# Altium footprint library Micro Switch.PcbLib: 75 footprints (part 2 of 5)
Each footprint in its own frame and in the unit in brackets; x right, y up, seen from the top. Pads: shape width x height; smd on the part's side, far side on the other; paste and mask are expansions set on the pad; w line width, h text height; cw(c..) or ccw(c..) is an arc to the next point about the centre after c.
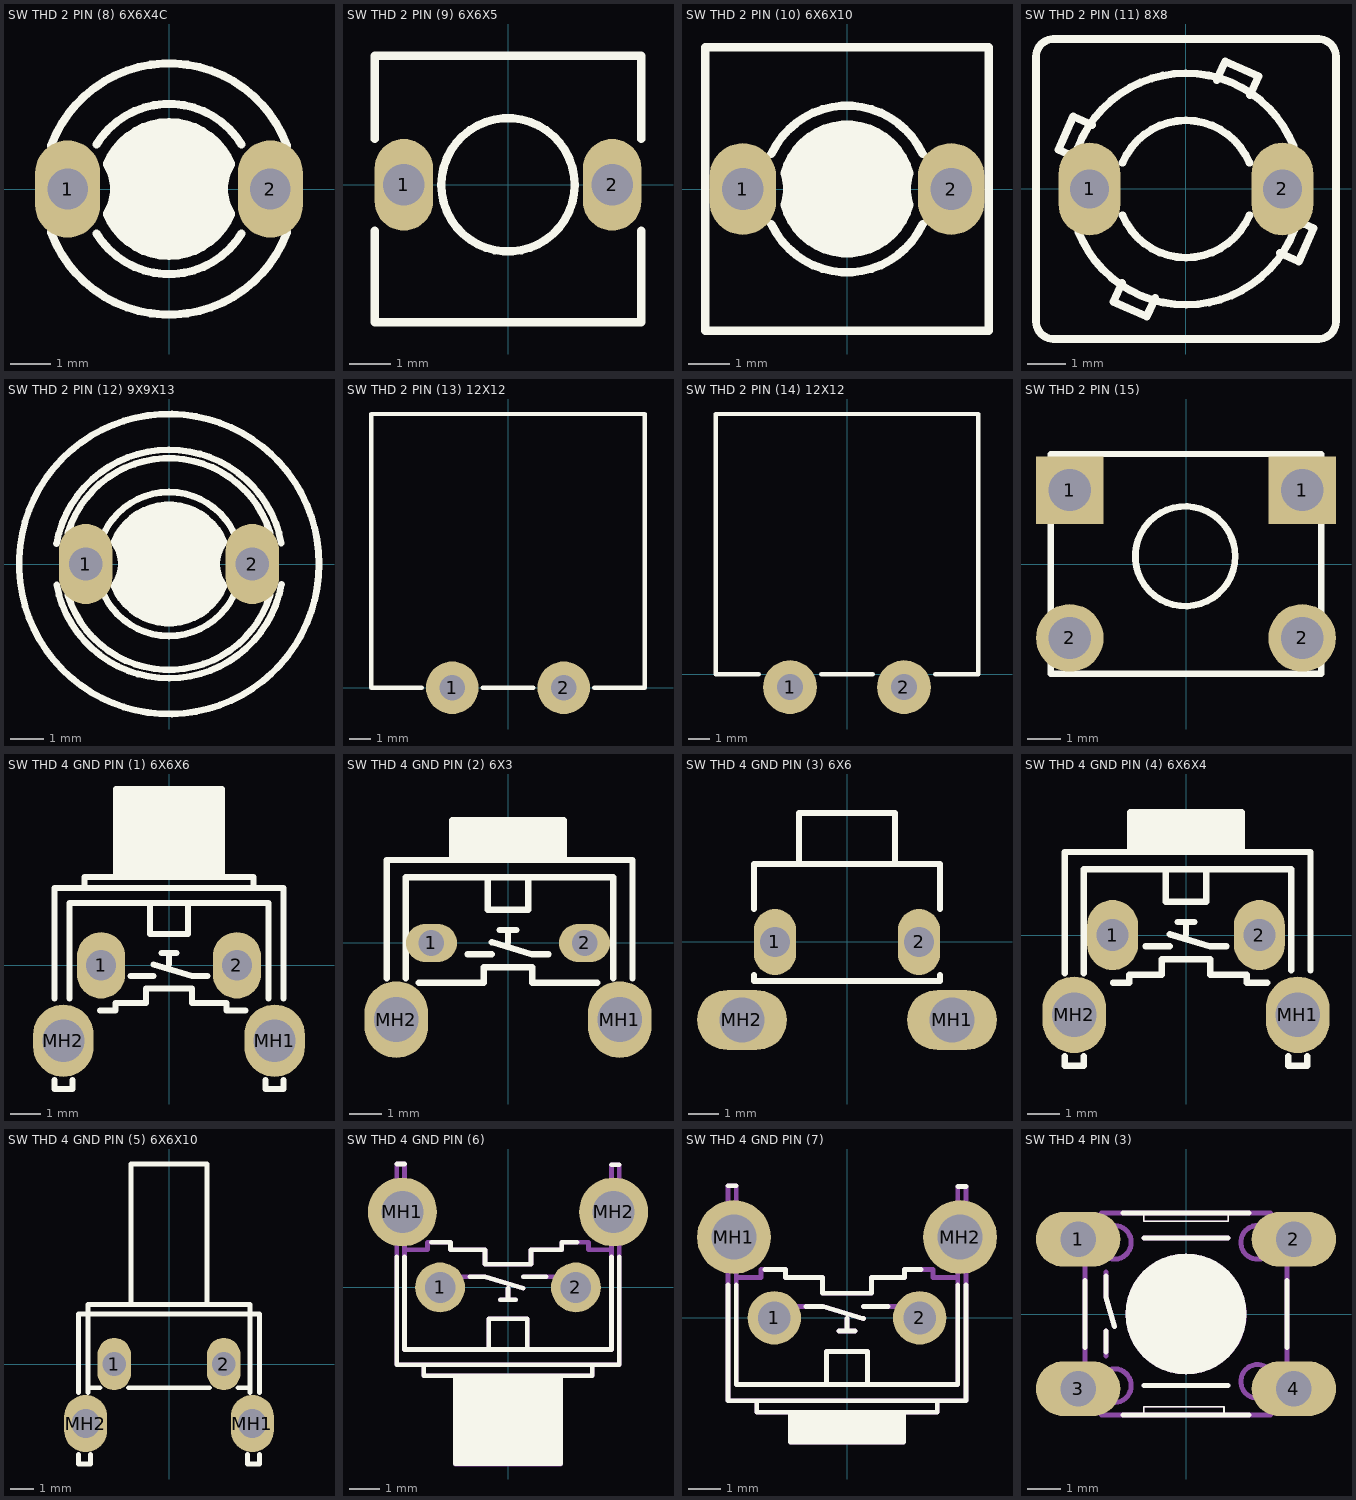
[diagram p1: the footprints below, top view; thin cyan lines are the x and y axes]

## SW THD 2 PIN (8) 6X6X4C [mm]
height 4.3
pads (2):
  oval 1.6x2.4 hole 1 mask+0.1: 1(-2.5,0) 2(2.5,0)
Top Overlay:
  region: -1.533,-0.613 -1.456,-0.471 -1.366,-0.161 -1.366,0.161 -1.456,0.471 -1.533,0.613 -1.472,0.766 -1.292,1.041 -1.062,1.275 -0.79,1.459 -0.486,1.586 -0.164,1.651 0.164,1.651 0.486,1.586 0.79,1.459 1.062,1.275 1.292,1.041 1.472,0.766 1.533,0.613 1.456,0.471 1.366,0.161 1.366,-0.161 1.456,-0.471 1.533,-0.613 1.472,-0.766 1.292,-1.041 1.062,-1.275 0.79,-1.459 0.486,-1.586 0.164,-1.651 -0.164,-1.651 -0.486,-1.586 -0.79,-1.459 -1.062,-1.275 -1.292,-1.041 -1.472,-0.766
  lines w0.2: -2.912,-1.059 ccw(c0,0) 2.912,-1.059 ; -2.912,1.059 cw(c0,0) 2.912,1.059 ; -1.789,-1.1 ccw(c0,0) 1.789,-1.1 ; -1.789,1.1 cw(c0,0) 1.789,1.1 ; -1.533,-0.613 ccw(c0,0) 1.533,-0.613 cw(c2.5,0) 1.533,0.613 ccw(c0,0) -1.533,0.613 cw(c-2.5,0) -1.533,-0.613
3D body "SKRGAA.STEP": height 4.33, standoff -3.47, extent -3.159,-3.1 3.16,3.1

## SW THD 2 PIN (9) 6X6X5 [mm]
pads (2):
  oval 1.4x2.2 hole 1 mask+0.1: 1(-2.5,0) 2(2.5,0)
Top Overlay:
  circle w0.2: c0,0 r1.6
  lines w0.2: -3.2,-1.1 -3.2,-3.3 3.2,-3.3 3.2,-1.1 ; -3.2,1.1 -3.2,3.1 3.2,3.1 3.2,1.1
3D body "82574 tact switch.stp": height 5, standoff -5.08, extent -3.117,-3.2 3.117,3.029

## SW THD 2 PIN (10) 6X6X10 [mm]
height 9.5
pads (2):
  oval 1.6x2.2 hole 1 mask+0.1: 1(-2.5,0) 2(2.5,0)
Top Overlay:
  region: -1.499,-0.375 -1.469,-0.284 -1.435,-0.096 -1.435,0.096 -1.469,0.284 -1.499,0.375 -1.457,0.541 -1.303,0.847 -1.086,1.112 -0.816,1.323 -0.506,1.47 -0.171,1.545 0.171,1.545 0.506,1.47 0.816,1.323 1.086,1.112 1.303,0.847 1.457,0.541 1.499,0.375 1.469,0.284 1.435,0.096 1.435,-0.096 1.469,-0.284 1.499,-0.375 1.457,-0.541 1.303,-0.847 1.086,-1.112 0.816,-1.323 0.506,-1.47 0.171,-1.545 -0.171,-1.545 -0.506,-1.47 -0.816,-1.323 -1.086,-1.112 -1.303,-0.847 -1.457,-0.541
  lines w0.2: -1.816,-0.838 ccw(c0,0) 1.816,-0.838 ; -1.816,0.838 cw(c0,0) 1.816,0.838 ; -3.4,-3.4 3.4,-3.4 3.4,3.4 -3.4,3.4 -3.4,-3.4 ; -1.499,-0.375 ccw(c-2.5,0) -1.499,0.375 cw(c0,0) 1.499,0.375 ccw(c2.5,0) 1.499,-0.375 cw(c0,0) -1.499,-0.375
3D body "SKQKAJ.STEP": height 9.53, standoff -3.47, extent -3.3,-3.3 3.3,3.3

## SW THD 2 PIN (11) 8X8 [mm]
height 5.5
pads (2):
  oval 1.6x2.4 hole 1 mask+0.1: 1(-2.5,0) 2(2.5,0)
Top Overlay:
  lines w0.2: -3.886,-3.429 ccw(c-3.429,-3.429) -3.429,-3.886 ; -3.886,3.429 cw(c-3.429,3.429) -3.429,3.886 ; -3.059,0.906 -3.302,1.016 -2.921,1.88 -2.435,1.659 ; -2.801,1.075 cw(c0,0) 2.795,1.091 ; -2.795,-1.091 ccw(c0,0) 2.801,-1.075 ; -1.659,-2.435 -1.88,-2.921 -1.016,-3.302 -0.795,-2.816 ; -1.643,-0.68 ccw(c0,0) 1.643,-0.68 ; -1.643,0.68 cw(c0,0) 1.643,0.68 ; 0.795,2.816 1.016,3.302 1.88,2.921 1.659,2.435 ; 2.435,-1.659 2.921,-1.88 3.302,-1.016 3.059,-0.906 ; 3.429,-3.886 ccw(c3.429,-3.429) 3.886,-3.429 ; 3.886,3.428 cw(c3.886,3.428) 3.886,3.429 ccw(c3.429,3.429) 3.429,3.886 ; 3.429,3.886 ccw(c3.429,3.886) 3.429,3.886
  lines w0.203: -3.886,-3.429 -3.886,3.429 ; -3.429,-3.886 3.429,-3.886 ; -3.429,3.886 3.429,3.886 ; 3.886,-3.429 3.886,3.428
3D body "SKPDAC.STEP": height 5.53, standoff -3.47, extent -3.9,-4.1 3.9,3.9

## SW THD 2 PIN (12) 9X9X13 [mm]
height 13
pads (2):
  oval 1.6x2.4 hole 1 mask+0.1: 1(-2.5,0) 2(2.5,0)
Top Overlay:
  circle w0.2: c0,0 r4.5
  region: -1.656,-0.653 -1.605,-0.581 -1.522,-0.427 -1.466,-0.261 -1.437,-0.088 -1.437,0.087 -1.465,0.26 -1.522,0.426 -1.605,0.58 -1.655,0.652 -1.654,0.653 -1.589,0.818 -1.396,1.116 -1.147,1.37 -0.854,1.57 -0.527,1.707 -0.179,1.778 0.176,1.778 0.524,1.708 0.852,1.571 1.145,1.371 1.394,1.118 1.587,0.82 1.653,0.655 1.656,0.653 1.605,0.581 1.522,0.427 1.466,0.261 1.437,0.088 1.437,-0.087 1.465,-0.26 1.522,-0.426 1.605,-0.58 1.655,-0.652 1.654,-0.653 1.589,-0.818 1.396,-1.116 1.147,-1.37 0.854,-1.57 0.527,-1.707 0.179,-1.778 -0.176,-1.778 -0.524,-1.708 -0.852,-1.571 -1.145,-1.371 -1.394,-1.118 -1.587,-0.82 -1.653,-0.655
  lines w0.2: -3.373,0.617 cw(c0,0) 3.371,0.628 ; -3.371,-0.628 ccw(c0,0) 3.373,-0.617 ; -3.038,0.924 cw(c0,0) 3.037,0.926 ; -3.037,-0.926 ccw(c0,0) 3.038,-0.924 ; -1.954,-0.919 ccw(c0,0) 1.953,-0.92 ; -1.953,0.92 cw(c0,0) 1.954,0.919 ; -1.656,-0.653 ccw(c-2.5,0) -1.655,0.652 ; -1.654,0.653 cw(c0,0) 1.653,0.655 ; -1.653,-0.655 ccw(c0,0) 1.654,-0.653 ; 1.655,-0.652 cw(c2.5,0) 1.656,0.653
3D body "SKRCAC.STEP": height 13.03, standoff -3.47, extent -4.517,-4.5 4.517,4.5

## SW THD 2 PIN (13) 12X12 [mm]
height 9
pads (2):
  round 2.5 hole 1.2 mask+0.1: 1(-2.65,0) 2(2.65,0)
Top Overlay:
  lines w0.2: -4.1,0 -6.5,0 -6.5,13 6.5,13 6.5,0 4.1,0 ; -1.2,0 1.2,0
3D body: height 6.5, standoff 0, extent -6,0 6,12
3D body: height 9.1, standoff 0, extent -2.688,3.303 2.7,8.697

## SW THD 2 PIN (14) 12X12 [mm]
height 9
pads (2):
  round 2.5 hole 1.2 mask+0.1: 1(-2.65,-0.6) 2(2.65,-0.6)
Top Overlay:
  lines w0.2: -4.1,0 -6.1,0 -6.1,12.1 6.1,12.1 6.1,0 4.1,0 ; -1.2,0 1.2,0
3D body: height 3.85, standoff -1.85, extent 2.15,-0.8 3.15,-0.4
3D body: height 3.9, standoff 3.5, extent 2.15,-0.8 3.15,0
3D body: height 3.9, standoff 3.5, extent -3.15,-0.8 -2.15,0
3D body: height 3.85, standoff -1.85, extent -3.15,-0.8 -2.15,-0.4
3D body: height 9.1, standoff 0, extent -2.7,3.3 2.7,8.7
3D body: height 6.5, standoff 0, extent -6,0 6,12

## SW THD 2 PIN (15) [mil]
pads (4):
  rect 80x80 hole 50: 1(-137.5,87.5) 1(137.5,87.5)
  round 80 hole 50: 2(-137.5,-87.5) 2(137.5,-87.5)
Top Overlay:
  circle w7.87: c-0.89,9.15 r59.06
  lines w7: -160,130 160,130
  lines w7.87: -160,130 -160,-130 160,-130 160,130
3D body "SW3dPS-Touche DTS-6X_V2008.STEP": height 205.04, standoff -120.04, extent -154.9,-121.09 156.9,123

## SW THD 4 GND PIN (1) 6X6X6 [mm]
height 7.4
pads (4):
  oval 1.6x2.2 hole 1 mask+0.1: 1(-2.25,0) 2(2.25,0)
  oval 2x2.4 hole 1.4 mask+0.1: MH1(3.5,-2.5) MH2(-3.5,-2.5)
Top Overlay:
  region: 1.75,5.842 -1.75,5.842 -1.75,2.921 1.75,2.921
  lines w0.2: -3.8,-3.8 -3.8,-4.1 -3.2,-4.1 -3.2,-3.8 ; -3.8,-1.1 -3.8,2.565 -2.794,2.565 ; -3.3,-1.1 -3.3,2.057 -0.635,2.057 ; -2.286,-1.499 -1.778,-1.499 -1.778,-1.245 -0.762,-1.245 -0.762,-0.762 0.762,-0.762 0.762,-1.245 1.905,-1.245 1.905,-1.499 2.54,-1.499 ; -1.27,-0.356 -0.508,-0.356 ; -0.508,0.025 0.762,-0.356 1.27,-0.356 ; -0.254,0.406 0,0.406 ; 0,0.025 0,0.406 ; 0.254,0.406 0,0.406 ; 2.794,2.565 2.794,2.921 1.75,2.921 ; 3.2,-3.8 3.2,-4.1 3.8,-4.1 3.8,-3.8 ; 3.3,-1.1 3.3,2.057 0.635,2.057 ; 3.8,-1.1 3.8,2.565 -2.794,2.565 ; -2.794,2.565 -2.794,2.921 -1.75,2.921 ; -1.75,2.921 -1.75,5.842 1.75,5.842 1.75,2.921 ; -1.75,2.921 1.75,2.921 ; -0.635,2.057 -0.635,1.041 0.635,1.041 0.635,2.057 ; -0.635,2.057 0.635,2.057
3D body "SKHHLU.STEP": height 7.43, standoff -3.47, extent -4.249,-4.042 4.249,5.858

## SW THD 4 GND PIN (2) 6X3 [mm]
height 7.4
pads (4):
  oval 1.6x1.2 hole 0.8 mask+0.1: 1(-2.4,0) 2(2.4,0)
  oval 2x2.4 hole 1.4 mask+0.1: MH1(3.5,-2.4) MH2(-3.5,-2.4)
Top Overlay:
  region: 1.75,3.85 -1.75,3.85 -1.75,2.6 1.75,2.6
  lines w0.2: -3.8,-1.1 -3.8,2.6 3.9,2.6 3.9,-1.1 ; -3.2,-1.1 -3.2,2.057 -0.635,2.057 ; -2.8,-1.245 -0.762,-1.245 -0.762,-0.762 0.762,-0.762 0.762,-1.245 2.8,-1.245 ; -1.75,2.6 -1.75,3.85 1.75,3.85 1.75,2.6 ; -1.27,-0.356 -0.508,-0.356 ; -0.508,0.025 0.762,-0.356 1.27,-0.356 ; -0.254,0.406 0,0.406 ; 0,0.025 0,0.406 ; 0.254,0.406 0,0.406 ; 3.3,-1.1 3.3,2.057 0.635,2.057 ; -0.635,2.057 -0.635,1.041 0.635,1.041 0.635,2.057 ; -0.635,2.057 0.635,2.057
3D body "43411.stp": height 4.4, standoff -2.5, extent -4.19,-3.228 4.19,3.908

## SW THD 4 GND PIN (3) 6X6 [mm]
pads (4):
  oval 1.4x2.2 hole 1 mask+0.1: 1(-2.4,0) 2(2.4,0)
  oval 3x2 hole 1.5 mask+0.1: MH1(3.5,-2.6) MH2(-3.5,-2.6)
Top Overlay:
  lines w0.2: -3.1,-1.1 -3.1,-1.3 3.1,-1.3 3.1,-1.1 ; -3.1,1.1 -3.1,2.6 3.1,2.6 3.1,1.1 ; -1.6,2.6 -1.6,4.3 1.6,4.3 1.6,2.6
3D body "User Library-TL1105 Tactile Switch 6x6 mm rightAngle.step": height 7.2, standoff -3.4, extent -4.11,-4.05 4.108,4.25

## SW THD 4 GND PIN (4) 6X6X4 [mm]
height 7.4
pads (4):
  oval 1.6x2.2 hole 1 mask+0.1: 1(-2.3,0) 2(2.3,0)
  oval 2x2.4 hole 1.4 mask+0.1: MH1(3.5,-2.5) MH2(-3.5,-2.5)
Top Overlay:
  region: 1.75,3.85 -1.75,3.85 -1.75,2.6 1.75,2.6
  lines w0.2: -3.8,-3.8 -3.8,-4.1 -3.2,-4.1 -3.2,-3.8 ; -3.8,-1.2 -3.8,2.6 3.9,2.6 3.9,-1.1 ; -3.2,-1.2 -3.2,2.057 -0.635,2.057 ; -2.286,-1.499 -1.778,-1.499 -1.778,-1.245 -0.762,-1.245 -0.762,-0.762 0.762,-0.762 0.762,-1.245 1.905,-1.245 1.905,-1.499 2.54,-1.499 ; -1.75,2.6 -1.75,3.85 1.75,3.85 1.75,2.6 ; -1.27,-0.356 -0.508,-0.356 ; -0.508,0.025 0.762,-0.356 1.27,-0.356 ; -0.254,0.406 0,0.406 ; 0,0.025 0,0.406 ; 0.254,0.406 0,0.406 ; 3.2,-3.8 3.2,-4.1 3.8,-4.1 3.8,-3.8 ; 3.3,-1.1 3.3,2.057 0.635,2.057 ; -0.635,2.057 0.635,2.057 ; -0.635,2.057 -0.635,1.041 0.635,1.041 0.635,2.057
3D body "SKHHLM.STEP": height 7.43, standoff -3.47, extent -4.249,-4.042 4.249,3.858

## SW THD 4 GND PIN (5) 6X6X10 [mm]
height 4
pads (4):
  oval 1.4x2.2 hole 1 mask+0.1: 1(-2.3,0) 2(2.3,0)
  oval 1.8x2.4 hole 1.2 mask+0.1: MH1(3.5,-2.5) MH2(-3.5,-2.5)
Top Overlay:
  lines w0.2: -3.8,-3.8 -3.8,-4.2 -3.3,-4.2 -3.3,-3.8 ; -3.8,-1.2 -3.8,2.1 -3.4,2.1 3.4,2.1 3.8,2.1 3.8,-1.2 ; -3.4,-1.2 -3.4,2.5 3.4,2.5 3.4,-1.2 ; -3.4,-1 -2.9,-1 ; -1.7,-1 1.7,-1 ; -1.6,2.5 -1.6,8.4 1.6,8.4 1.6,2.5 ; 2.9,-1 3.4,-1 ; 3.3,-3.8 3.3,-4.2 3.8,-4.2 3.8,-3.8
3D body "User Library-SWITCH, TACTILE, RIGHT ANGLE, 12VDC, 50MA, 8_35MM ACTUATOR, WEALTH METAL TC-0240Z.step": height 7, standoff -4, extent -3.7,-4.15 3.7,8.35

## SW THD 4 GND PIN (6) [mil]
height 291.34
pads (4):
  round 65 hole 40: 1(-88.58,0) 2(88.58,0)
  round 90 hole 55: MH1(-137.8,98.43) MH2(137.8,98.43)
Top Overlay:
  region: -68.9,-230 68.9,-230 68.9,-115 -68.9,-115
  lines w6: -145,40 -145,-101 110,-101 ; -145,161 -135,161 ; -135,40 -135,29 -135,-31 -135,-81 -25,-81 ; -110,-101 -110,-115 -68.9,-115 ; -100,59 -75,59 -75,49 -30,49 -30,30 30,30 30,49 70,49 70,59 90,59 ; -50,14 -30,14 20,-1 ; -10,-16 0,-16 ; 0,-1 0,-16 ; 10,-16 0,-16 ; 20,14 50,14 ; 135,40 135,29 135,-31 135,-81 25,-81 ; 135,160 145,160 ; 145,40 145,-101 110,-101 ; -68.9,-115 -68.9,-230 68.9,-230 68.9,-115 ; -68.9,-115 68.9,-115 ; -25,-81 25,-81 ; -25,-81 -25,-41 25,-41 25,-81 ; 68.9,-115 110,-115 110,-101
Mechanical 3:
  region: -68.9,-230.31 68.9,-230.31 68.9,-115 -68.9,-115
  lines w6: -110,-101 -110,-115 -68.9,-115 ; -65,14 -30,14 20,-1 ; -10,-16 0,-16 ; 0,-1 0,-16 ; 10,-16 0,-16 ; 20,14 65,14 ; -135,49 -135,161 -145,161 -145,49 -145,-101 110,-101 ; -135,49 -105,49 -105,59 -75,59 -75,49 -30,49 -30,30 30,30 30,49 70,49 70,59 105,59 105,49 135,49 ; -135,49 -135,29 -135,-31 -135,-81 -25,-81 ; -68.9,-115 68.9,-115 ; -68.9,-115 -68.9,-230.31 68.9,-230.31 68.9,-115 ; -25,-81 25,-81 ; -25,-81 -25,-41 25,-41 25,-81 ; 25,-81 135,-81 135,-31 135,29 135,49 ; 68.9,-115 110,-115 110,-101 ; 110,-101 145,-101 145,49 145,160 135,160 135,49
3D body "SKHHLU.STEP": height 292.34, standoff -136.8, extent -167.27,-230.62 167.27,159.14

## SW THD 4 GND PIN (7) [mil]
height 291.34
pads (4):
  round 65 hole 40: 1(-88.58,0) 2(88.58,0)
  round 90 hole 55: MH1(-137.8,98.43) MH2(137.8,98.43)
Top Overlay:
  region: -68.9,-151.57 68.9,-151.57 68.9,-115 -68.9,-115
  lines w6: -145,40 -145,-101 110,-101 ; -145,161 -135,161 ; -135,40 -135,29 -135,-31 -135,-81 -25,-81 ; -110,-101 -110,-115 -68.9,-115 ; -100,59 -75,59 -75,49 -30,49 -30,30 30,30 30,49 70,49 70,59 90,59 ; -50,14 -30,14 20,-1 ; -10,-16 0,-16 ; 0,-1 0,-16 ; 10,-16 0,-16 ; 20,14 50,14 ; 135,40 135,29 135,-31 135,-81 25,-81 ; 135,160 145,160 ; 145,40 145,-101 110,-101 ; -68.9,-115 -68.9,-151.57 68.9,-151.57 68.9,-115 ; -68.9,-115 68.9,-115 ; -25,-81 25,-81 ; -25,-81 -25,-41 25,-41 25,-81 ; 68.9,-115 110,-115 110,-101
Mechanical 3:
  region: -68.9,-151.57 -68.9,-115 68.9,-115 68.9,-151.57
  lines w6: -110,-101 -110,-115 -68.9,-115 ; -65,14 -30,14 20,-1 ; -10,-16 0,-16 ; 0,-1 0,-16 ; 10,-16 0,-16 ; 20,14 65,14 ; -135,49 -135,161 -145,161 -145,49 -145,-101 110,-101 ; -135,49 -105,49 -105,59 -75,59 -75,49 -30,49 -30,30 30,30 30,49 70,49 70,59 105,59 105,49 135,49 ; -135,49 -135,29 -135,-31 -135,-81 -25,-81 ; -68.9,-115 68.9,-115 ; -68.9,-115 -68.9,-151.57 68.9,-151.57 68.9,-115 ; -25,-81 25,-81 ; -25,-81 -25,-41 25,-41 25,-81 ; 25,-81 135,-81 135,-31 135,29 135,49 ; 68.9,-115 110,-115 110,-101 ; 110,-101 145,-101 145,49 145,160 135,160 135,49
3D body "SKHHLM.STEP": height 292.34, standoff -136.8, extent -167.27,-151.89 167.27,159.14

## SW THD 4 PIN (3) [mm]
height 13
pads (4):
  oval 2.54x1.651 hole 1.067: 1(-3.25,2.25) 2(3.25,2.25) 3(-3.25,-2.25) 4(3.25,-2.25)
Top Overlay:
  circle w0.152: c0,0 r1.75
  region: 0,-1.75 -0.172,-1.75 -0.51,-1.683 -0.829,-1.551 -1.116,-1.359 -1.359,-1.116 -1.551,-0.829 -1.683,-0.51 -1.75,-0.172 -1.75,0 -1.75,0.172 -1.683,0.51 -1.551,0.829 -1.359,1.116 -1.116,1.359 -0.829,1.551 -0.51,1.683 -0.172,1.75 0,1.75 0.172,1.75 0.51,1.683 0.829,1.551 1.116,1.359 1.359,1.116 1.551,0.829 1.683,0.51 1.75,0.172 1.75,0 1.75,-0.172 1.683,-0.51 1.551,-0.829 1.359,-1.116 1.116,-1.359 0.829,-1.551 0.51,-1.683 0.172,-1.75
  lines w0.051: -1.27,-3.048 -1.27,-2.794 1.143,-2.794 1.143,-3.048 ; -1.27,3.048 -1.27,2.794 1.27,2.794 1.27,3.048
  lines w0.152: -3.048,-1.016 -3.048,-0.762 -3.048,0.762 -3.048,1.016 ; -2.413,-1.143 -2.413,-0.508 ; -2.413,1.143 -2.413,0.508 -2.159,-0.381 ; -1.905,-3.048 -1.27,-3.048 1.143,-3.048 1.905,-3.048 ; -1.905,3.048 -1.27,3.048 1.27,3.048 1.905,3.048 ; -1.27,-2.159 1.27,-2.159 ; -1.27,2.286 1.27,2.286 ; 3.048,-1.016 3.048,-0.762 3.048,0.762 3.048,1.016
Mechanical 3:
  circle w0.152: c0,0 r1.75
  circle w0.152: c-2.159,2.159 r0.508
  circle w0.152: c2.159,2.159 r0.508
  circle w0.152: c2.159,-2.032 r0.508
  circle w0.152: c-2.159,-2.159 r0.508
  region: 0.063,-1.769 -0.109,-1.769 -0.448,-1.702 -0.766,-1.57 -1.053,-1.379 -1.296,-1.135 -1.488,-0.848 -1.62,-0.53 -1.687,-0.192 -1.687,-0.019 -1.687,0.153 -1.62,0.491 -1.488,0.81 -1.296,1.096 -1.053,1.34 -0.766,1.531 -0.448,1.663 -0.109,1.731 0.063,1.731 0.235,1.731 0.573,1.663 0.892,1.531 1.179,1.34 1.422,1.096 1.614,0.81 1.746,0.491 1.813,0.153 1.813,-0.019 1.813,-0.192 1.746,-0.53 1.614,-0.848 1.422,-1.135 1.179,-1.379 0.892,-1.57 0.573,-1.702 0.235,-1.769
  lines w0.051: -1.27,-3.048 -1.27,-2.794 1.143,-2.794 1.143,-3.048 ; -1.27,3.048 -1.27,2.794 1.27,2.794 1.27,3.048
  lines w0.152: -2.413,-1.27 -2.413,-0.508 ; -2.413,1.27 -2.413,0.508 -2.159,-0.381 ; -1.27,-2.159 1.27,-2.159 ; -1.27,2.286 1.27,2.286 ; -3.048,-2.54 -3.048,-1.016 -3.048,-0.762 -3.048,0.762 -3.048,1.016 -3.048,2.54 -2.54,3.048 -2.159,3.048 -1.27,3.048 1.27,3.048 2.159,3.048 2.54,3.048 3.048,2.54 3.048,1.016 3.048,0.762 3.048,-0.762 3.048,-1.016 3.048,-2.54 2.54,-3.048 2.159,-3.048 1.143,-3.048 -1.27,-3.048 -2.159,-3.048 -2.54,-3.048 -3.048,-2.54
3D body "SKHHDT.STEP": height 13.03, standoff -3.47, extent -3.949,-3.1 3.949,3.1